# Altium schematic symbol library NXP_60_26022015.SCHLIB: 1306 symbols (part 6 of 28)
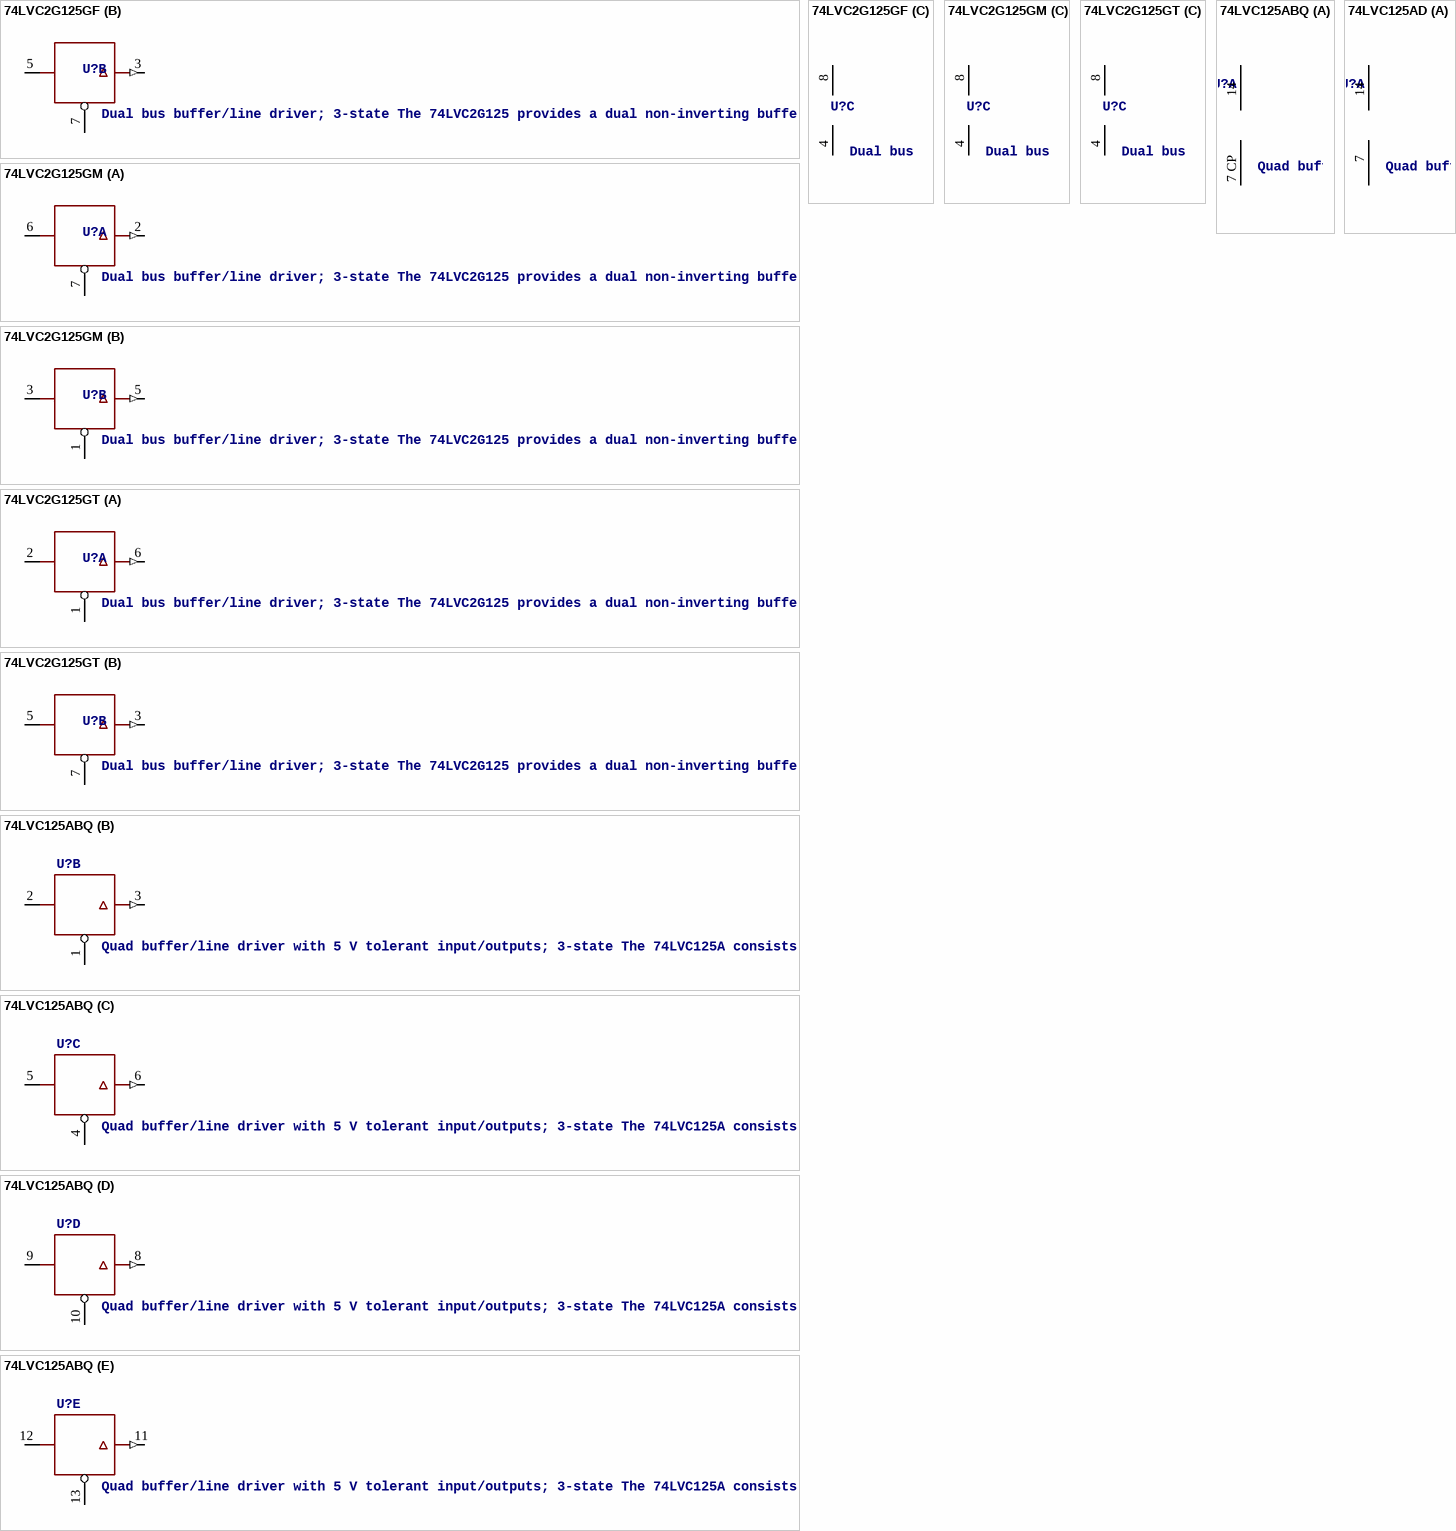
[diagram p190: symbols 74LVC2G125GF to 74LVC125AD]

## 74LVC2G125GT
designator U?, comment Dual bus buffer/line driver; 3-state The 74LVC2G125 provides a dual non-inverting buffer/line driver with 3-state output. The 3-state output is controlled by the output enable input (pin nOE). A HIGH-level at pin nOE causes the output to assume a high-impedance OFF-state. Schmitt trigger action at all inputs makes the circuit highly tolerant of slower input rise and fall times. Inputs can be driven from either 3.3 V or 5 V devices. This feature allows the use of these devices as translators in a mixed 3.3 V and 5 V environment. This device is fully specified for partial power-down applications using IOFF. The IOFF circuitry disables the output, preventing a damaging backflow current through the device when it is powered down.    AAL Eindhoven MK
footprint SOT833-1
part A pins: 1 !OE, 2 A, 6 Y (out)
part B pins: 3 Y (out), 5 A, 7 !OE
part C pins: 4 GND (power), 8 VCC (power)

## 74LVC125ABQ
designator U?, comment Quad buffer/line driver with 5 V tolerant input/outputs; 3-state The 74LVC125A consists of four non-inverting buffers/line drivers with 3-state outputs (nY) that are controlled by the output enable input (nOE). A HIGH at nOE causes the outputs to assume a high-impedance OFF-state. Inputs can be driven from either 3.3 V or 5 V devices. When disabled, up to 5.5 V can be applied to the outputs.   AAL Eindhoven MK
footprint SOT762-1
part A pins: 7 CP GND (power), 14 VCC (power)
part B pins: 1 !OE, 2 A, 3 Y (out)
part C pins: 4 !OE, 5 A, 6 Y (out)
part D pins: 8 Y (out), 9 A, 10 !OE
part E pins: 11 Y (out), 12 A, 13 !OE

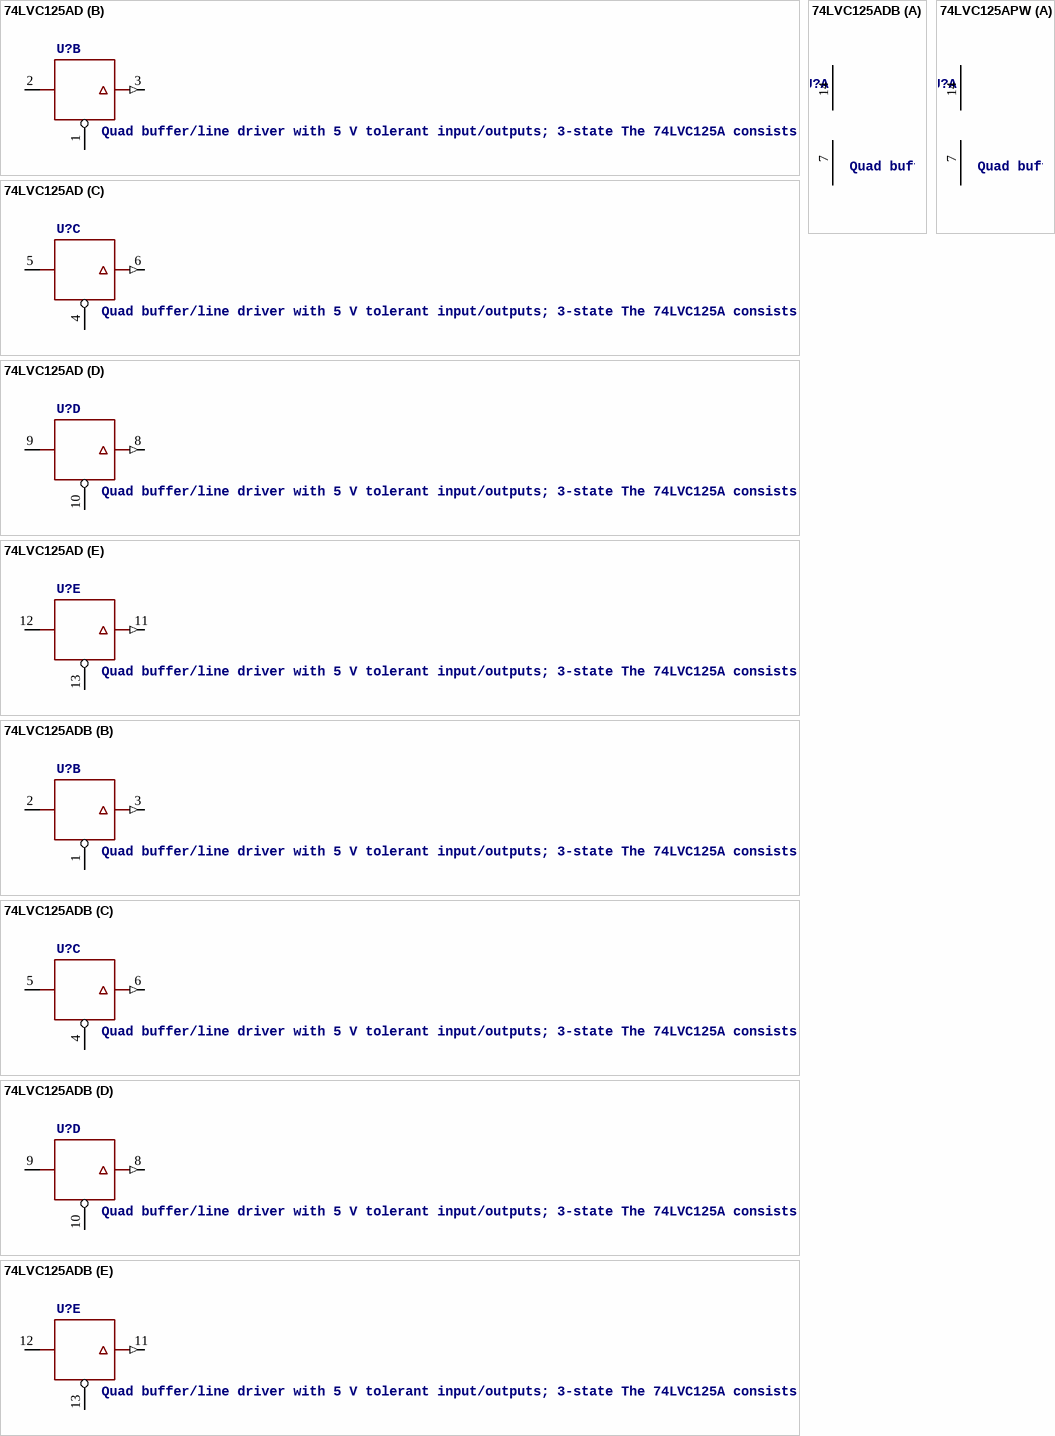
[diagram p27: symbols 74LVC125AD to 74LVC125APW]

## 74LVC125AD
designator U?, comment Quad buffer/line driver with 5 V tolerant input/outputs; 3-state The 74LVC125A consists of four non-inverting buffers/line drivers with 3-state outputs (nY) that are controlled by the output enable input (nOE). A HIGH at nOE causes the outputs to assume a high-impedance OFF-state. Inputs can be driven from either 3.3 V or 5 V devices. When disabled, up to 5.5 V can be applied to the outputs.   AAL Eindhoven MK
12NC: 9352 317 00118
footprint SOT108-1
part A pins: 7 GND (power), 14 VCC (power)
part B pins: 1 !OE, 2 A, 3 Y (out)
part C pins: 4 !OE, 5 A, 6 Y (out)
part D pins: 8 Y (out), 9 A, 10 !OE
part E pins: 11 Y (out), 12 A, 13 !OE

## 74LVC125ADB
designator U?, comment Quad buffer/line driver with 5 V tolerant input/outputs; 3-state The 74LVC125A consists of four non-inverting buffers/line drivers with 3-state outputs (nY) that are controlled by the output enable input (nOE). A HIGH at nOE causes the outputs to assume a high-impedance OFF-state. Inputs can be driven from either 3.3 V or 5 V devices. When disabled, up to 5.5 V can be applied to the outputs.   AAL Eindhoven MK
footprint SOT337
part A pins: 7 GND (power), 14 VCC (power)
part B pins: 1 !OE, 2 A, 3 Y (out)
part C pins: 4 !OE, 5 A, 6 Y (out)
part D pins: 8 Y (out), 9 A, 10 !OE
part E pins: 11 Y (out), 12 A, 13 !OE

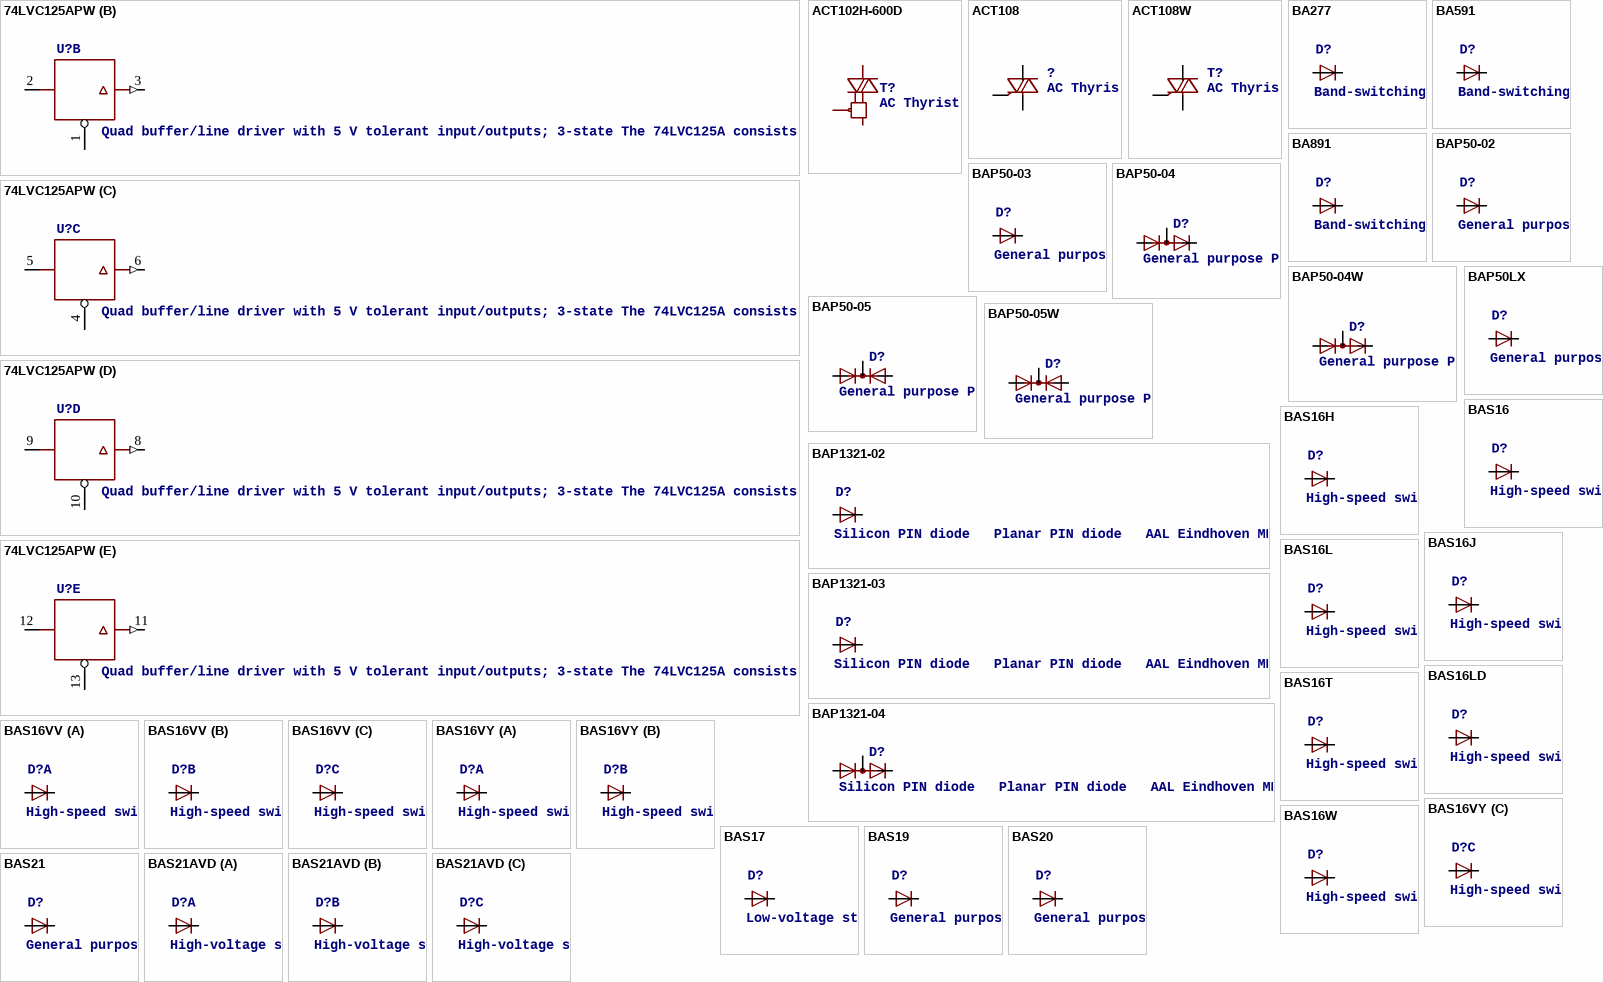
[diagram p28: symbols 74LVC125APW to BAS21AVD]

## 74LVC125APW
designator U?, comment Quad buffer/line driver with 5 V tolerant input/outputs; 3-state The 74LVC125A consists of four non-inverting buffers/line drivers with 3-state outputs (nY) that are controlled by the output enable input (nOE). A HIGH at nOE causes the outputs to assume a high-impedance OFF-state. Inputs can be driven from either 3.3 V or 5 V devices. When disabled, up to 5.5 V can be applied to the outputs.   AAL Eindhoven MK
footprint SOT402-1
part A pins: 7 GND (power), 14 VCC (power)
part B pins: 1 !OE, 2 A, 3 Y (out)
part C pins: 4 !OE, 5 A, 6 Y (out)
part D pins: 8 Y (out), 9 A, 10 !OE
part E pins: 11 Y (out), 12 A, 13 !OE

## ACT102H-600D
designator T?, comment AC Thyristor power switch An AC Thyristor power switch with very high noise immunity and over-voltage protection configured for negative gate triggering in a SOT96-1 (SO8) small surface-mountable plastic package   AAL Eindhoven MK
12NC: 9340 645 54118
footprint SOT96-1
pins: 2 LD, 5 G, 6 7 CM

## ACT108
designator ?, comment AC Thyristor power switch  AC Thyristor power switch in a SOT54 plastic package with self-protective capabilities against low and high energy transients   AAL Eindhoven MK
footprint SOT54A
pins: 1 T1, 2 G, 3 T2

## ACT108W
designator T?, comment AC Thyristor power switch AC Thyristor power switch in a SOT223 surface-mountable plastic package with self-protective capabilities against low and high energy transients   AAL Eindhoven MK
12NC: 9340 644 42135; 12NC: 9340 633 73135
footprint SOT223
pins: 1 T2, 2 4 T1, 3 G

## BA277
designator D?, comment Band-switching diode Planar high performance band-switching diode in a small plastic SOD523 (SC-79) SMD package.   AAL Eindhoven MK
footprint SOD523
pins: 1 K, 2 A

## BA591
designator D?, comment Band-switching diode The BA591 is a planar, high performance band-switching diode in the very small SOD323 (SC-76) SMD plastic package.   AAL Eindhoven MK
footprint SOD323(F)
pins: 1 K, 2 A

## BA891
designator D?, comment Band-switching diode The BA891 is a planar high performance band-switching diode in the ultra small SOD523 SMD plastic package.   AAL Eindhoven MK
footprint SOD523
pins: 1 K, 2 A

## BAP50-02
designator D?, comment General purpose PIN diode General purpose PIN diode   AAL Eindhoven MK
footprint SOD523
pins: 1 K, 2 A

## BAP50-03
designator D?, comment General purpose PIN diode General purpose PIN diode   AAL Eindhoven MK
footprint SOD323(F)
pins: 1 K, 2 A

## BAP50-04
designator D?, comment General purpose PIN diode Two planar PIN diodes in series configuration.   AAL Eindhoven MK
footprint SOT23
pins: 1 A1, 2 K2, 3 K1A2

## BAP50-04W
designator D?, comment General purpose PIN diode Two planar PIN diodes in series configuration.   AAL Eindhoven MK
footprint SOT323
pins: 1 A1, 2 K2, 3 K1A2

## BAP50-05
designator D?, comment General purpose PIN diode Two planar PIN diodes in common cathode configuration.    AAL Eindhoven MK
footprint SOT23
pins: 1 A1, 2 A2, 3 K1K2

## BAP50-05W
designator D?, comment General purpose PIN diode Two planar PIN diodes in common cathode configuration.    AAL Eindhoven MK
footprint SOT323
pins: 1 A1, 2 A2, 3 K1K2

## BAP50LX
designator D?, comment General purpose PIN diode General purpose PIN diode   AAL Eindhoven MK
footprint SOD882(T)
pins: 1 K, 2 A

## BAP1321-02
designator D?, comment Silicon PIN diode   Planar PIN diode   AAL Eindhoven MK
footprint SOD523
pins: 1 K, 2 A

## BAP1321-03
designator D?, comment Silicon PIN diode   Planar PIN diode   AAL Eindhoven MK
footprint SOD323(F)
pins: 1 K, 2 A

## BAP1321-04
designator D?, comment Silicon PIN diode   Planar PIN diode   AAL Eindhoven MK
footprint SOT23
pins: 1 A1, 2 K2, 3 K1A2

## BAS16
designator D?, comment High-speed switching diode High-speed switching diode, encapsulated in small Surface-Mounted Device (SMD) plastic packages.   AAL Eindhoven MK
footprint SOT23
pins: 1 A, 3 K

## BAS16H
designator D?, comment High-speed switching diode High-speed switching diode, encapsulated in small Surface-Mounted Device (SMD) plastic packages.   AAL Eindhoven MK
footprint SOD123F
pins: 1 K, 2 A

## BAS16J
designator D?, comment High-speed switching diode High-speed switching diode, encapsulated in small Surface-Mounted Device (SMD) plastic packages.   AAL Eindhoven MK
footprint SOD323(F)
pins: 1 K, 2 A

## BAS16L
designator D?, comment High-speed switching diode High-speed switching diode, encapsulated in small Surface-Mounted Device (SMD) plastic packages.   AAL Eindhoven MK
footprint SOD882(T)
pins: 1 K, 2 A

## BAS16LD
designator D?, comment High-speed switching diode High-speed switching diode, encapsulated in small Surface-Mounted Device (SMD) plastic packages.   AAL Eindhoven MK
footprint SOD882D
pins: 1 K, 2 A

## BAS16T
designator D?, comment High-speed switching diode High-speed switching diode, encapsulated in small Surface-Mounted Device (SMD) plastic packages.   AAL Eindhoven MK
footprint SOT416
pins: 1 A, 3 K

## BAS16VV
designator D?, comment High-speed switching diodes High-speed switching diodes, encapsulated in small Surface-Mounted Device (SMD) plastic packages.   AAL Eindhoven MK
footprint SOT666
part A pins: 1 A, 6 K
part B pins: 2 A, 5 K
part C pins: 3 A, 4 K

## BAS16VY
designator D?, comment High-speed switching diodes High-speed switching diodes, encapsulated in small Surface-Mounted Device (SMD) plastic packages.   AAL Eindhoven MK
footprint SOT363
part A pins: 1 A, 6 K
part B pins: 2 A, 5 K
part C pins: 3 A, 4 K

## BAS16W
designator D?, comment High-speed switching diode High-speed switching diode, encapsulated in small Surface-Mounted Device (SMD) plastic packages.   AAL Eindhoven MK
footprint SOT323
pins: 1 A, 3 K

## BAS17
designator D?, comment Low-voltage stabistor Low-voltage stabilization diode in a small SOT23 plastic package.   AAL Eindhoven MK
footprint SOT23
pins: 1 A, 3 K

## BAS19
designator D?, comment General purpose diode The BAS19, BAS20 and BAS21 are general purpose diodes fabricated in planar technology, and encapsulated in a small SOT23 plastic SMD package.   AAL Eindhoven MK
footprint SOT23
pins: 1 A, 3 K

## BAS20
designator D?, comment General purpose diode The BAS19, BAS20 and BAS21 are general purpose diodes fabricated in planar technology, and encapsulated in a small SOT23 plastic SMD package.   AAL Eindhoven MK
footprint SOT23
pins: 1 A, 3 K

## BAS21
designator D?, comment General purpose diode The BAS19, BAS20 and BAS21 are general purpose diodes fabricated in planar technology, and encapsulated in a small SOT23 plastic SMD package.   AAL Eindhoven MK
footprint SOT23
pins: 1 A, 3 K

## BAS21AVD
designator D?, comment High-voltage switching diodes Triple high-voltage switching diodes, encapsulated in a SOT457 (SC-74) small Surface-Mounted Device (SMD) plastic package.   AAL Eindhoven MK
footprint SOT457
part A pins: 1 A, 6 K
part B pins: 2 A, 5 K
part C pins: 3 A, 4 K

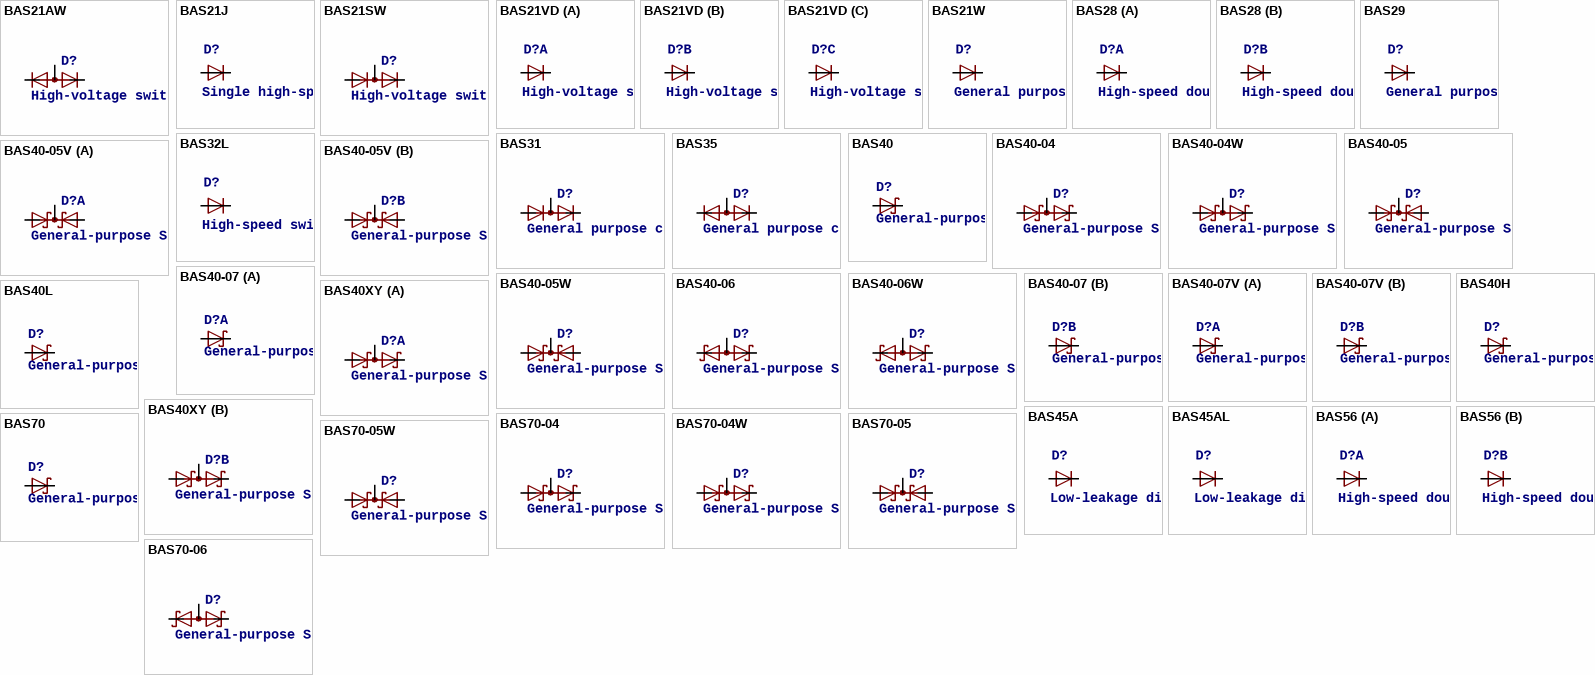
[diagram p29: symbols BAS21AW to BAS70-06]

## BAS21AW
designator D?, comment High-voltage switching diodes High-voltage switching diodes, encapsulated in a very small Surface-Mounted Device (SMD) plastic package.    AAL Eindhoven MK
footprint SOT323
pins: 1 K1, 2 K2, 3 A1A2

## BAS21J
designator D?, comment Single high-speed switching diode Single high-speed switching diode, encapsulated in a SOD323F (SC-90) very small and ?at lead Surface-Mounted Device (SMD) plastic package.   AAL Eindhoven MK
footprint SOD323(F)
pins: 1 K, 2 A

## BAS21SW
designator D?, comment High-voltage switching diodes High-voltage switching diodes, encapsulated in a very small Surface-Mounted Device (SMD) plastic package.    AAL Eindhoven MK
footprint SOT323
pins: 1 A1, 2 K2, 3 K1A2

## BAS21VD
designator D?, comment High-voltage switching diodes Triple high-voltage switching diodes, encapsulated in a SOT457 (SC-74) small Surface-Mounted Device (SMD) plastic package.   AAL Eindhoven MK
footprint SOT457
part A pins: 1 K, 6 A
part B pins: 2 K, 5 A
part C pins: 3 K, 4 A

## BAS21W
designator D?, comment General purpose diode The BAS19, BAS20 and BAS21 are general purpose diodes fabricated in planar technology, and encapsulated in a small SOT23 plastic SMD package.   AAL Eindhoven MK
12NC: 9340 632 68115
footprint SOT323
pins: 1 A, 3 K

## BAS28
designator D?, comment High-speed double diode  Two high-speed switching diodes fabricated in planar technology, and encapsulated in a small SOT143B Surface-Mounted Device (SMD) plastic package. The diodes are not connected.   AAL Eindhoven MK
footprint SOT143(B)
part A pins: 1 K, 4 A
part B pins: 2 K, 3 A

## BAS29
designator D?, comment General purpose controlled avalanche diode  General purpose switching diodes fabricated in planar technology, and encapsulated in small rectangular plastic SMD SOT23 packages. The BAS29 consists of a single diode. The BAS31 has two diodes in series. The BAS35 has two diodes with a common anode.    AAL Eindhoven MK
footprint SOT23
pins: 1 A, 3 K

## BAS31
designator D?, comment General purpose controlled avalanche diode (double)  General purpose switching diodes fabricated in planar technology, and encapsulated in small rectangular plastic SMD SOT23 packages. The BAS29 consists of a single diode. The BAS31 has two diodes in series. The BAS35 has two diodes with a common anode.    AAL Eindhoven MK
footprint SOT23
pins: 1 A1, 2 K2, 3 K1A2

## BAS32L
designator D?, comment High-speed switching diode  Single high-speed switching diode, fabricated in planar technology, and encapsulated in a small hermetically sealed glass SOD80C Surface-Mounted Device (SMD) package.   AAL Eindhoven MK
footprint SOD80C
pins: 1 K, 2 A

## BAS35
designator D?, comment General purpose controlled avalanche diode (double)  General purpose switching diodes fabricated in planar technology, and encapsulated in small rectangular plastic SMD SOT23 packages. The BAS29 consists of a single diode. The BAS31 has two diodes in series. The BAS35 has two diodes with a common anode.    AAL Eindhoven MK
footprint SOT23
pins: 1 K1, 2 K2, 3 A1A2

## BAS40
designator D?, comment General-purpose Schottky diode  General-purpose Schottky diodes in small Surface-Mounted Device (SMD) plastic packages.    AAL Eindhoven MK
12NC: 9340 345 30215
footprint SOT23
pins: 1 A, 3 K

## BAS40-04
designator D?, comment General-purpose Schottky diodes General-purpose Schottky diodes in small Surface-Mounted Device (SMD) plastic packages   AAL Eindhoven MK
FARNELL: 1907602
footprint SOT23
pins: 1 A1, 2 K2, 3 K1A2

## BAS40-04W
designator D?, comment General-purpose Schottky diodes General-purpose Schottky diodes in small Surface-Mounted Device (SMD) plastic packages   AAL Eindhoven MK
footprint SOT323
pins: 1 A1, 2 K2, 3 K1A2

## BAS40-05
designator D?, comment General-purpose Schottky diodes General-purpose Schottky diodes in small Surface-Mounted Device (SMD) plastic packages   AAL Eindhoven MK
footprint SOT23
pins: 1 A1, 2 A2, 3 K1K2

## BAS40-05V
designator D?, comment General-purpose Schottky diodes  General-purpose Schottky diodes in small Surface-Mounted Device (SMD) plastic packages.   AAL Eindhoven MK
footprint SOT666
part A pins: 1 A1, 2 A2, 6 K1K2
part B pins: 3 K1K2, 4 A1, 5 A2

## BAS40-05W
designator D?, comment General-purpose Schottky diodes General-purpose Schottky diodes in small Surface-Mounted Device (SMD) plastic packages   AAL Eindhoven MK
footprint SOT323
pins: 1 A1, 2 A2, 3 K1K2

## BAS40-06
designator D?, comment General-purpose Schottky diodes General-purpose Schottky diodes in small Surface-Mounted Device (SMD) plastic packages   AAL Eindhoven MK
footprint SOT23
pins: 1 K1, 2 K2, 3 A1A2

## BAS40-06W
designator D?, comment General-purpose Schottky diodes General-purpose Schottky diodes in small Surface-Mounted Device (SMD) plastic packages   AAL Eindhoven MK
footprint SOT323
pins: 1 K1, 2 K2, 3 A1A2

## BAS40-07
designator D?, comment General-purpose Schottky diodes  General-purpose Schottky diodes in small Surface-Mounted Device (SMD) plastic packages.   AAL Eindhoven MK
FARNELL: 8734364
footprint SOT143(B)
part A pins: 1 K, 4 A
part B pins: 2 K, 3 A

## BAS40-07V
designator D?, comment General-purpose Schottky diodes  General-purpose Schottky diodes in small Surface-Mounted Device (SMD) plastic packages.   AAL Eindhoven MK
footprint SOT666
part A pins: 1 A, 6 K
part B pins: 3 K, 4 A

## BAS40H
designator D?, comment General-purpose Schottky diode  General-purpose Schottky diodes in small Surface-Mounted Device (SMD) plastic packages.    AAL Eindhoven MK
12NC: 9340 592 81115
footprint SOD123F
pins: 1 K, 2 A

## BAS40L
designator D?, comment General-purpose Schottky diode  General-purpose Schottky diodes in small Surface-Mounted Device (SMD) plastic packages.    AAL Eindhoven MK
12NC: 9340 572 53315
footprint SOD882(T)
pins: 1 K, 2 A

## BAS40XY
designator D?, comment General-purpose Schottky diodes  General-purpose Schottky diodes in small Surface-Mounted Device (SMD) plastic packages.   AAL Eindhoven MK
footprint SOT363
part A pins: 1 A1, 2 K2, 6 K1A2
part B pins: 3 K1A2, 4 A1, 5 K2

## BAS45A
designator D?, comment Low-leakage diode Epitaxial medium-speed switching diode with a low leakage current, encapsulated in a small hermetically sealed glass SOD80C Surface-Mounted Device (SMD) package.   AAL Eindhoven MK
footprint SOD68
pins: A, C K

## BAS45AL
designator D?, comment Low-leakage diode Epitaxial medium-speed switching diode with a low leakage current, encapsulated in a small hermetically sealed glass SOD80C Surface-Mounted Device (SMD) package.   AAL Eindhoven MK
footprint SOD80C
pins: 1 K, 2 A

## BAS56
designator D?, comment High-speed double diode Two high-speed switching diodes fabricated in planar technology, and encapsulated in a small SOT143B Surface-Mounted Device (SMD) plastic package. The diodes are not connected.   AAL Eindhoven MK
footprint SOT143(B)
part A pins: 1 K, 4 A
part B pins: 2 K, 3 A

## BAS70
designator D?, comment General-purpose Schottky diode  General-purpose Schottky diodes in small Surface-Mounted Device (SMD) plastic packages.    AAL Eindhoven MK
footprint SOT23
pins: 1 A, 3 K

## BAS70-04
designator D?, comment General-purpose Schottky diodes General-purpose Schottky diodes in small Surface-Mounted Device (SMD) plastic packages   AAL Eindhoven MK
footprint SOT23
pins: 1 A1, 2 K2, 3 K1A2

## BAS70-04W
designator D?, comment General-purpose Schottky diodes General-purpose Schottky diodes in small Surface-Mounted Device (SMD) plastic packages   AAL Eindhoven MK
footprint SOT323
pins: 1 A1, 2 K2, 3 K1A2

## BAS70-05
designator D?, comment General-purpose Schottky diodes General-purpose Schottky diodes in small Surface-Mounted Device (SMD) plastic packages   AAL Eindhoven MK
footprint SOT23
pins: 1 A1, 2 A2, 3 K1K2

## BAS70-05W
designator D?, comment General-purpose Schottky diodes General-purpose Schottky diodes in small Surface-Mounted Device (SMD) plastic packages   AAL Eindhoven MK
footprint SOT323
pins: 1 A1, 2 A2, 3 K1K2

## BAS70-06
designator D?, comment General-purpose Schottky diodes General-purpose Schottky diodes in small Surface-Mounted Device (SMD) plastic packages   AAL Eindhoven MK
footprint SOT23
pins: 1 K1, 2 K2, 3 A1A2

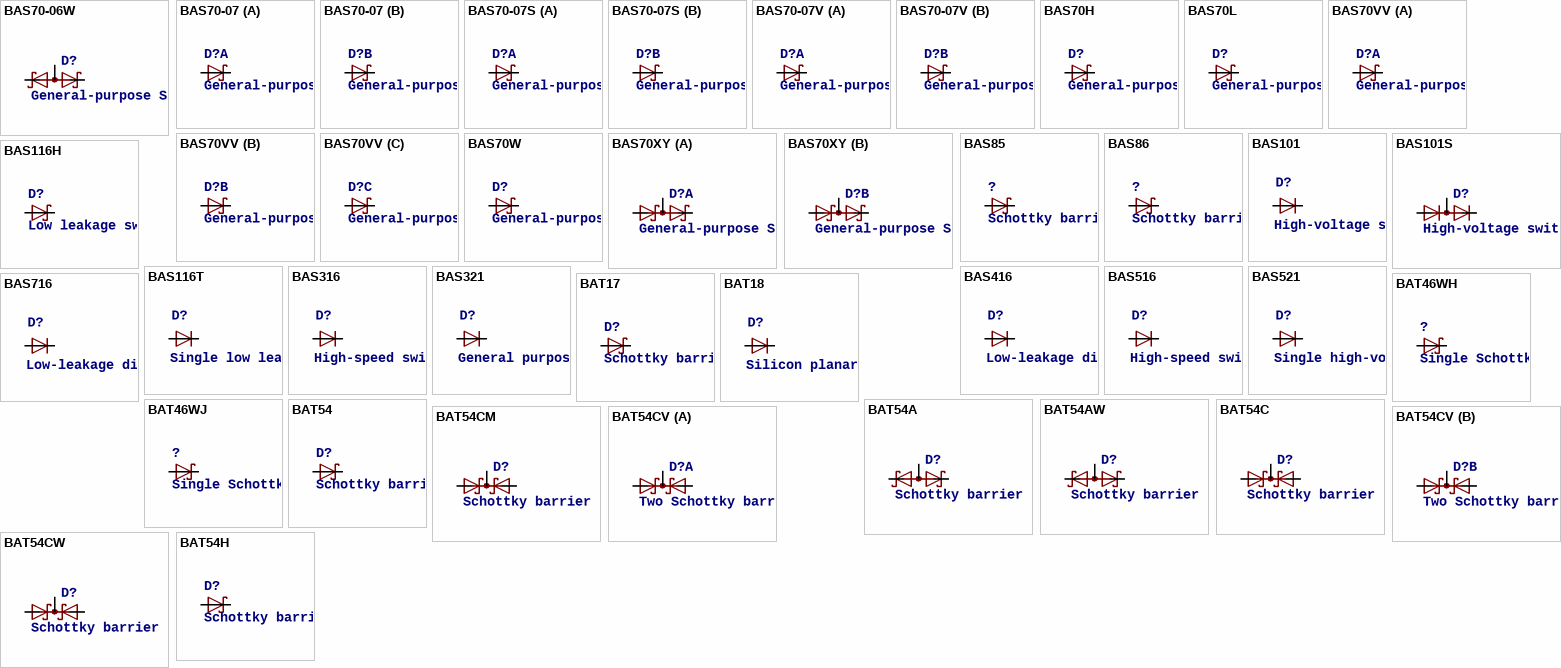
[diagram p30: symbols BAS70-06W to BAT54H]

## BAS70-06W
designator D?, comment General-purpose Schottky diodes General-purpose Schottky diodes in small Surface-Mounted Device (SMD) plastic packages   AAL Eindhoven MK
footprint SOT323
pins: 1 K1, 2 K2, 3 A1A2

## BAS70-07
designator D?, comment General-purpose Schottky diodes  General-purpose Schottky diodes in small Surface-Mounted Device (SMD) plastic packages.   AAL Eindhoven MK
footprint SOT143(B)
part A pins: 1 K, 4 A
part B pins: 2 K, 3 A

## BAS70-07S
designator D?, comment General-purpose Schottky diodes  General-purpose Schottky diodes in small Surface-Mounted Device (SMD) plastic packages.   AAL Eindhoven MK
footprint SOT363
part A pins: 1 A, 6 K
part B pins: 3 K, 4 A

## BAS70-07V
designator D?, comment General-purpose Schottky diodes  General-purpose Schottky diodes in small Surface-Mounted Device (SMD) plastic packages.   AAL Eindhoven MK
footprint SOT666
part A pins: 1 A, 6 K
part B pins: 3 K, 4 A

## BAS70H
designator D?, comment General-purpose Schottky diode  General-purpose Schottky diodes in small Surface-Mounted Device (SMD) plastic packages.    AAL Eindhoven MK
footprint SOD123F
pins: 1 K, 2 A

## BAS70L
designator D?, comment General-purpose Schottky diode  General-purpose Schottky diodes in small Surface-Mounted Device (SMD) plastic packages.    AAL Eindhoven MK
footprint SOD882(T)
pins: 1 K, 2 A

## BAS70VV
designator D?, comment General-purpose Schottky diodes General-purpose Schottky diodes in small Surface-Mounted Device (SMD) plastic packages.   AAL Eindhoven MK
footprint SOT666
part A pins: 1 A, 6 K
part B pins: 2 A, 5 K
part C pins: 3 A, 4 K

## BAS70W
designator D?, comment General-purpose Schottky diode  General-purpose Schottky diodes in small Surface-Mounted Device (SMD) plastic packages.    AAL Eindhoven MK
footprint SOT323
pins: 1 A, 3 K

## BAS70XY
designator D?, comment General-purpose Schottky diodes  General-purpose Schottky diodes in small Surface-Mounted Device (SMD) plastic packages.   AAL Eindhoven MK
footprint SOT363
part A pins: 1 A1, 2 K2, 6 K1A2
part B pins: 3 K1A2, 4 A1, 5 K2

## BAS85
designator ?, comment Schottky barrier diode Planar Schottky barrier diode with an integrated guard ring for stress protection, encapsulated in a small hermetically sealed glass SOD80C Surface-Mounted Device SMD package with tin-plated metal discs at each end. It is suitable for ?automatic placement? and as such it can withstand immersion soldering.   AAL Eindhoven MK
footprint SOD80C
pins: 1 K, 2 A

## BAS86
designator ?, comment Schottky barrier diode Planar Schottky barrier diode with an integrated guard ring against static discharges. This surface-mounted device is encapsulated in a small hermetically sealed SOD80C glass Surface-Mounted Device (SMD) package with tin-plated metal discs at each end. It is suitable for ?automatic placement? and as such it can withstand immersion soldering.   AAL Eindhoven MK
footprint SOD80C
pins: 1 K, 2 A

## BAS101
designator D?, comment High-voltage switching diode High-voltage switching diode, encapsulated in a SOT23 small Surface-Mounted Device (SMD) plastic package.   AAL Eindhoven MK
footprint SOT23
pins: 1 A, 3 K

## BAS101S
designator D?, comment High-voltage switching diodes High-voltage switching diodes, encapsulated in a SOT23 small Surface-Mounted Device (SMD) plastic package.   AAL Eindhoven MK
footprint SOT23
pins: 1 A1, 2 K2, 3 K1A2

## BAS116H
designator D?, comment Low leakage switching diode Low leakage switching diode, encapsulated in a SOD123F small and flat lead Surface-Mounted Device (SMD) plastic package.    AAL Eindhoven MK
footprint SOD123F
pins: 1 K, 2 A

## BAS116T
designator D?, comment Single low leakage current switching diode Single low leakage current switching diode, encapsulated in an ultra small SOT416 (SC-75) Surface-Mounted Device (SMD) plastic package.   AAL Eindhoven MK
footprint SOT416
pins: 1 A, 3 K

## BAS316
designator D?, comment High-speed switching diode High-speed switching diode, encapsulated in small Surface-Mounted Device (SMD) plastic packages.   AAL Eindhoven MK
footprint SOD323(F)
pins: 1 K, 2 A

## BAS321
designator D?, comment General purpose diode The BAS321 is a general purpose diode fabricated in planar technology and encapsulated in a plastic SOD323 package.   AAL Eindhoven MK
footprint SOD323(F)
pins: 1 K, 2 A

## BAS416
designator D?, comment Low-leakage diode Epitaxial, medium-speed switching diode with a low leakage current encapsulated in a small SOD323 SMD plastic package.   AAL Eindhoven MK
footprint SOD323(F)
pins: 1 K, 2 A

## BAS516
designator D?, comment High-speed switching diode High-speed switching diode, encapsulated in small Surface-Mounted Device (SMD) plastic packages.   AAL Eindhoven MK
footprint SOD523
pins: 1 K, 2 A

## BAS521
designator D?, comment Single high-voltage switching diode Single high-voltage switching diode, fabricated in planar technology, and encapsulated in a SOD523 (SC-79) ultra small Surface-Mounted Device (SMD) plastic package.   AAL Eindhoven MK
footprint SOD523
pins: 1 K, 2 A

## BAS716
designator D?, comment Low-leakage diode  Epitaxial medium-speed switching diode with a low leakage current in an ultra small SOD523 (SC-79) SMD plastic package.   AAL Eindhoven MK
footprint SOD523
pins: 1 K, 2 A
